# Altium footprint library TI Interface 8-Bit Line Transceiver.PcbLib: 49 footprints (part 4 of 4)
Each footprint in its own frame and in the unit in brackets; x right, y up, seen from the top. Pads: shape width x height; smd on the part's side, far side on the other; paste and mask are expansions set on the pad; w line width, h text height; cw(c..) or ccw(c..) is an arc to the next point about the centre after c.
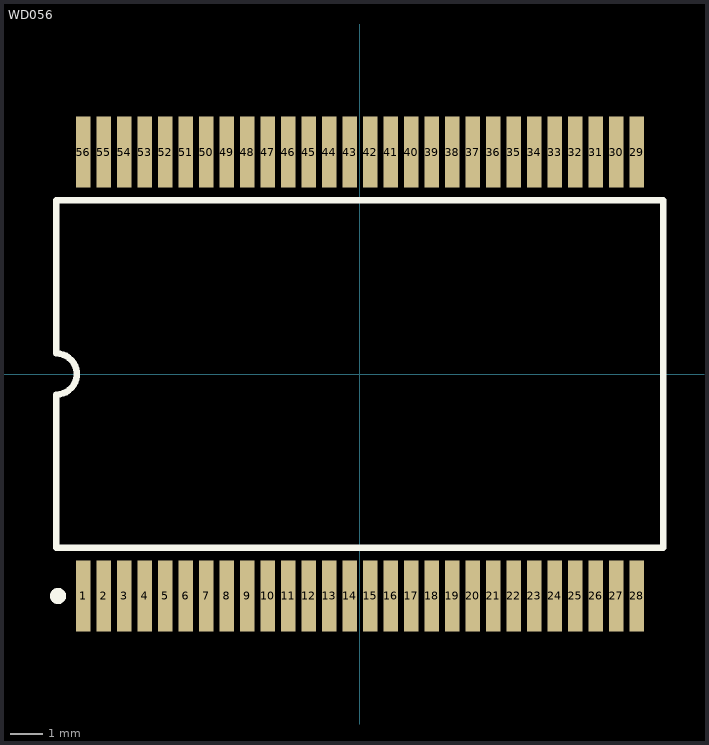
[diagram p3: the footprint, top view; thin cyan lines are the x and y axes]

## WD056 [mm] "DFP; 56 Leads; Body 18.8 x 9.9 mm (LxW max); Pitch 0.635 mm"
height 3.05
pads (56):
  rect 0.45x2.2 smd: 1(-8.572,-6.875) 2(-7.938,-6.875) 3(-7.302,-6.875) 4(-6.667,-6.875) 5(-6.032,-6.875) 6(-5.397,-6.875) 7(-4.763,-6.875) 8(-4.127,-6.875) 9(-3.492,-6.875) 10(-2.857,-6.875) 11(-2.222,-6.875) 12(-1.587,-6.875) 13(-0.953,-6.875) 14(-0.318,-6.875) 15(0.318,-6.875) 16(0.953,-6.875) 17(1.587,-6.875) 18(2.222,-6.875) 19(2.857,-6.875) 20(3.492,-6.875) 21(4.127,-6.875) 22(4.763,-6.875) 23(5.397,-6.875) 24(6.032,-6.875) 25(6.667,-6.875) 26(7.302,-6.875) 27(7.938,-6.875) 28(8.572,-6.875) 29(8.572,6.875) 30(7.938,6.875) 31(7.302,6.875) 32(6.667,6.875) 33(6.032,6.875) 34(5.397,6.875) 35(4.763,6.875) 36(4.127,6.875) 37(3.492,6.875) 38(2.857,6.875) 39(2.222,6.875) 40(1.587,6.875) 41(0.953,6.875) 42(0.318,6.875) 43(-0.318,6.875) 44(-0.953,6.875) 45(-1.587,6.875) 46(-2.222,6.875) 47(-2.857,6.875) 48(-3.492,6.875) 49(-4.127,6.875) 50(-4.763,6.875) 51(-5.397,6.875) 52(-6.032,6.875) 53(-6.667,6.875) 54(-7.302,6.875) 55(-7.938,6.875) 56(-8.572,6.875)
Top Overlay:
  circle w0.25: c-9.347,-6.875 r0.125
  lines w0.2: -9.4,-5.375 -9.4,-0.635 ccw(c-9.4,0) -9.4,0.635 -9.4,5.375 9.4,5.375 9.4,-5.375 -9.4,-5.375